# Altium footprint library Atlan.PcbLib: 283 footprints (part 10 of 18)
Each footprint in its own frame and in the unit in brackets; x right, y up, seen from the top. Pads: shape width x height; smd on the part's side, far side on the other; paste and mask are expansions set on the pad; w line width, h text height; cw(c..) or ccw(c..) is an arc to the next point about the centre after c.
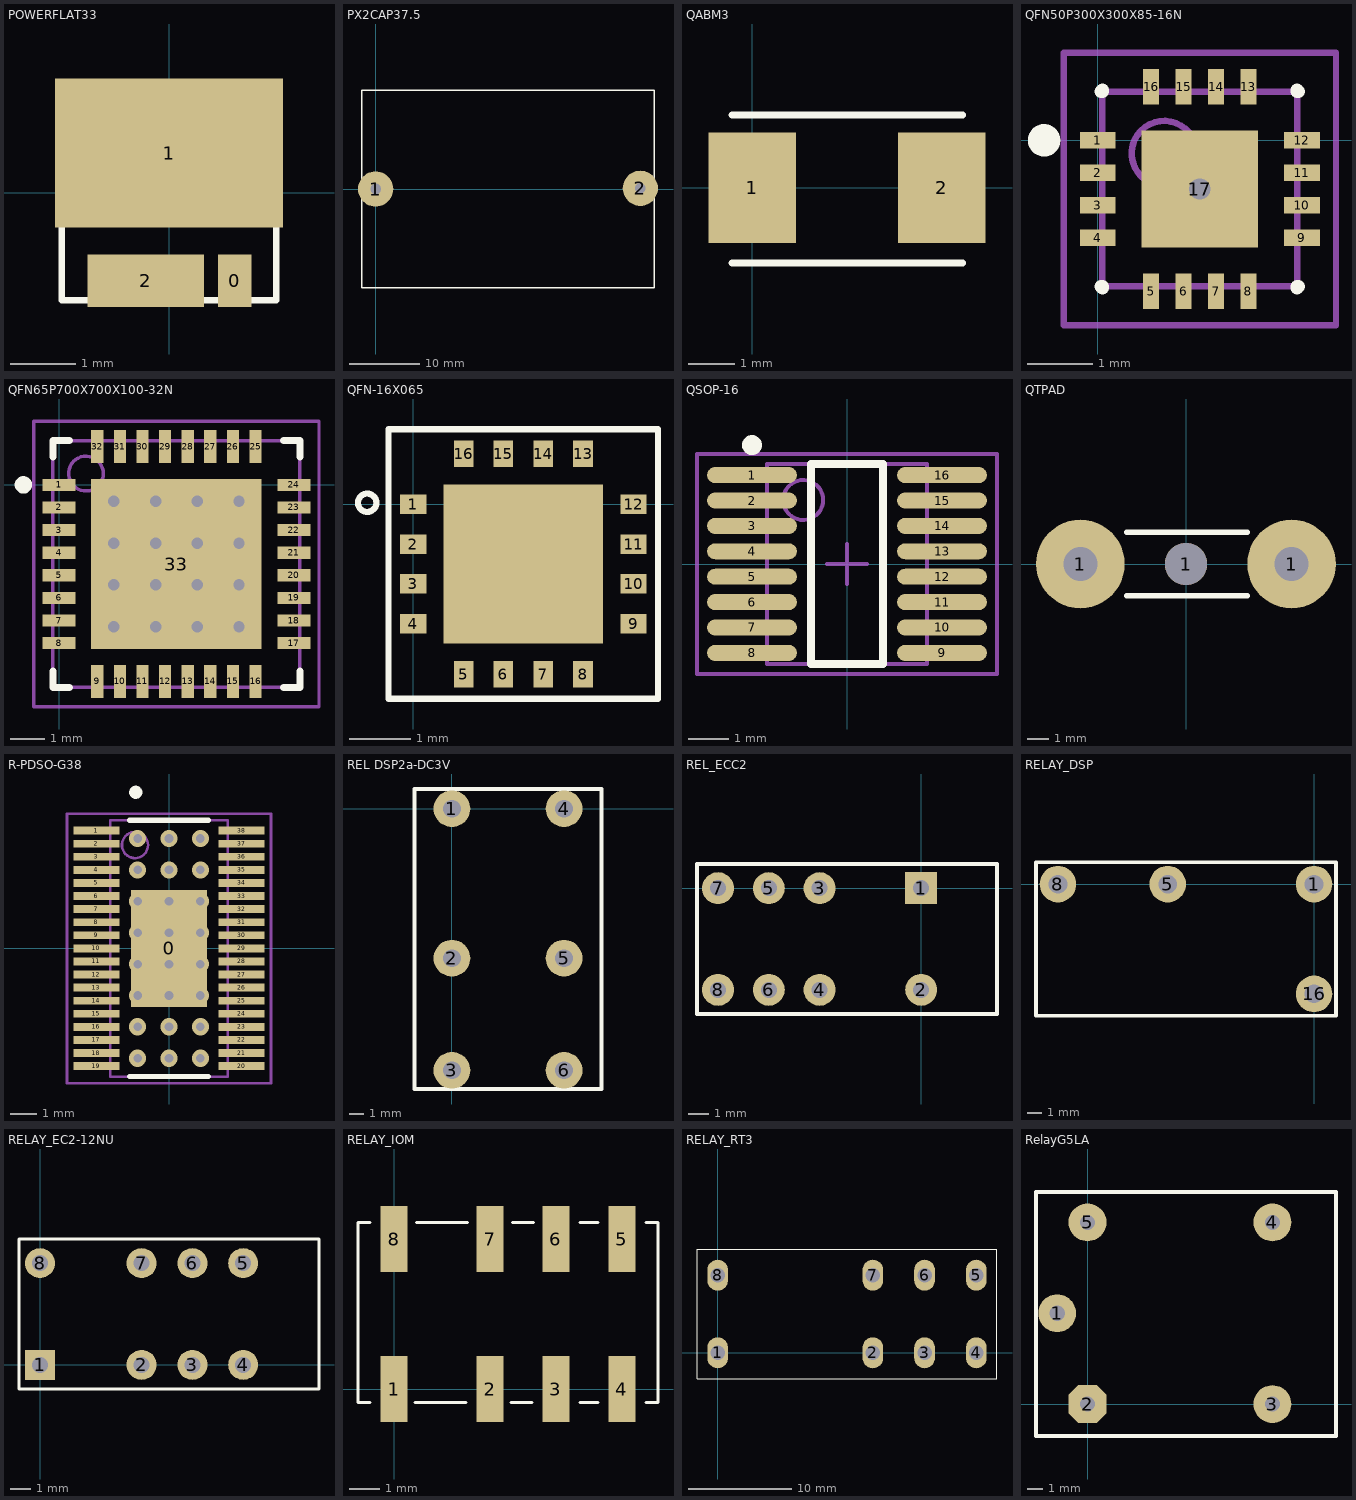
[diagram p9: the footprints below, top view; thin cyan lines are the x and y axes]

## POWERFLAT33 [mm]
pads (3):
  rect 0.52x0.8 smd: 0(1.01,-1.35)
  rect 3.5x2.28 smd: 1(0,0.61)
  rect 1.79x0.8 smd: 2(-0.355,-1.35)
Top Overlay:
  lines w0.1: -1.65,-1.65 -1.65,1.65 1.65,1.65 1.65,-1.65 -1.65,-1.65
3D body: height 1, standoff 0.1, extent -1.65,-1.65 1.65,1.65

## PX2CAP37.5 [mm]
pads (2):
  round 5 hole 1.5: 1(0,0) 2(37.5,0.1)
Top Overlay:
  lines w0.2: -2,-14 -2,14 39.5,14 39.5,-14 -2,-14
3D body: height 42.5, standoff 0, extent -2,-14 39.5,14

## QABM3 [mm]
pads (2):
  rect 1.9x2.4 smd: 1(0,0) 2(4.1,0)
Top Overlay:
  lines w0.15: -0.443,-1.625 4.557,-1.625 ; -0.443,1.575 4.557,1.575

## QFN50P300X300X85-16N [mm] "QFN, 16-Leads, Body 3,0x3,0mm (max), Pitch 0,50mm, IPC Medium Density"
height 0.85
pads (17):
  rect 0.55x0.25 smd: 1(0,0) 2(0,-0.5) 3(0,-1) 4(0,-1.5) 9(3.15,-1.5) 10(3.15,-1) 11(3.15,-0.5) 12(3.15,0)
  rect 0.25x0.55 smd: 5(0.825,-2.325) 6(1.325,-2.325) 7(1.825,-2.325) 8(2.325,-2.325) 13(2.325,0.825) 14(1.825,0.825) 15(1.325,0.825) 16(0.825,0.825)
  rect 1.8x1.8 smd: 17(1.575,-0.75)
via 1.575,-0.75 diameter 0.66 hole 0.33
Top Overlay:
  circle w0.25: c-0.825,0 r0.125
  lines w0.2: 0.05,-2.25 0.075,-2.25 0.075,-2.275 ; 0.05,0.75 0.075,0.75 0.075,0.775 ; 3.075,-2.275 3.075,-2.25 3.1,-2.25 ; 3.075,0.775 3.075,0.75 3.1,0.75
Mechanical 13:
  circle w0.1: c1.025,-0.2 r0.5
  lines w0.1: 0.075,-2.25 0.075,0.75 3.075,0.75 3.075,-2.25 0.075,-2.25
Mechanical 15:
  lines w0.1: 1.075,-0.75 2.075,-0.75 ; 1.575,-1.25 1.575,-0.25 ; -0.525,-2.85 -0.525,1.35 3.675,1.35 3.675,-2.85 -0.525,-2.85
3D body: height 0.85, standoff 0.05, extent 0.075,-2.25 3.075,0.75

## QFN65P700X700X100-32N [mm] "QFN, 32-Leads, Body 7,1x7,1mm (max), Pitch 0,65mm, IPC Medium Density"
height 1
pads (33):
  rect 0.95x0.35 smd: 1(0,0) 2(0,-0.65) 3(0,-1.3) 4(0,-1.95) 5(0,-2.6) 6(0,-3.25) 7(0,-3.9) 8(0,-4.55) 17(6.75,-4.55) 18(6.75,-3.9) 19(6.75,-3.25) 20(6.75,-2.6) 21(6.75,-1.95) 22(6.75,-1.3) 23(6.75,-0.65) 24(6.75,0)
  rect 0.35x0.95 smd: 9(1.1,-5.65) 10(1.75,-5.65) 11(2.4,-5.65) 12(3.05,-5.65) 13(3.7,-5.65) 14(4.35,-5.65) 15(5,-5.65) 16(5.65,-5.65) 25(5.65,1.1) 26(5,1.1) 27(4.35,1.1) 28(3.7,1.1) 29(3.05,1.1) 30(2.4,1.1) 31(1.75,1.1) 32(1.1,1.1)
  rect 4.9x4.9 smd: 33(3.375,-2.275)
via 1.575,-0.475 diameter 0.66 hole 0.33
via 2.775,-0.475 diameter 0.66 hole 0.33
via 3.975,-0.475 diameter 0.66 hole 0.33
via 5.175,-0.475 diameter 0.66 hole 0.33
via 1.575,-1.675 diameter 0.66 hole 0.33
via 2.775,-1.675 diameter 0.66 hole 0.33
via 3.975,-1.675 diameter 0.66 hole 0.33
via 5.175,-1.675 diameter 0.66 hole 0.33
via 1.575,-2.875 diameter 0.66 hole 0.33
via 2.775,-2.875 diameter 0.66 hole 0.33
via 3.975,-2.875 diameter 0.66 hole 0.33
via 5.175,-2.875 diameter 0.66 hole 0.33
via 1.575,-4.075 diameter 0.66 hole 0.33
via 2.775,-4.075 diameter 0.66 hole 0.33
via 3.975,-4.075 diameter 0.66 hole 0.33
via 5.175,-4.075 diameter 0.66 hole 0.33
Top Overlay:
  circle w0.25: c-1.025,0 r0.125
  lines w0.2: -0.175,-5.35 -0.175,-5.825 0.3,-5.825 ; -0.175,0.8 -0.175,1.275 0.3,1.275 ; 6.45,-5.825 6.925,-5.825 6.925,-5.35 ; 6.45,1.275 6.925,1.275 6.925,0.8
Mechanical 13:
  circle w0.1: c0.775,0.325 r0.5
  lines w0.1: -0.175,-5.825 -0.175,1.275 6.925,1.275 6.925,-5.825 -0.175,-5.825
Mechanical 15:
  lines w0.1: 2.875,-2.275 3.875,-2.275 ; 3.375,-2.775 3.375,-1.775 ; -0.725,-6.375 -0.725,1.825 7.475,1.825 7.475,-6.375 -0.725,-6.375
3D body: height 1, standoff 0.05, extent -0.175,-5.825 6.925,1.275

## QFN-16X065 [mm]
pads (17):
  rect 0.43x0.32 smd: 1(0,0) 2(0,-0.65) 3(0,-1.3) 4(0,-1.95) 9(3.6,-1.95) 10(3.6,-1.3) 11(3.6,-0.65) 12(3.6,0)
  rect 0.32x0.43 smd: 5(0.825,-2.775) 6(1.475,-2.775) 7(2.125,-2.775) 8(2.775,-2.775) 13(2.775,0.825) 14(2.125,0.825) 15(1.475,0.825) 16(0.825,0.825)
  rect 2.6x2.6 smd: ""(1.8,-0.975)
Top Overlay:
  circle w0.1: c-0.75,0.025 r0.15
  lines w0.1: -0.4,-3.175 -0.4,1.225 4,1.225 4,-3.175 -0.4,-3.175

## QSOP-16 [mm] "SOP, 16-Leads, Body 4.9x3.9mm, Pitch 0.635mm, IPC Medium Density"
height 1.76
pads (16):
  oval 2.25x0.4 smd: 1(-2.375,2.222) 2(-2.375,1.587) 3(-2.375,0.953) 4(-2.375,0.318) 5(-2.375,-0.318) 6(-2.375,-0.953) 7(-2.375,-1.587) 8(-2.375,-2.222) 9(2.375,-2.222) 10(2.375,-1.587) 11(2.375,-0.953) 12(2.375,-0.318) 13(2.375,0.318) 14(2.375,0.953) 15(2.375,1.587) 16(2.375,2.222)
Top Overlay:
  circle w0.25: c-2.375,2.973 r0.125
  lines w0.2: -0.9,-2.5 -0.9,2.5 0.9,2.5 0.9,-2.5 -0.9,-2.5
Mechanical 13:
  circle w0.1: c-1.095,1.6 r0.5
  lines w0.1: -1.995,-2.5 -1.995,2.5 1.995,2.5 1.995,-2.5 -1.995,-2.5
Mechanical 15:
  lines w0.1: -0.5,0 0.5,0 ; 0,-0.5 0,0.5 ; -3.75,-2.75 -3.75,2.75 3.75,2.75 3.75,-2.75 -3.75,-2.75
3D body: height 1.76, standoff 0, extent -1.995,-2.5 1.995,2.5

## QTPAD [mm]
pads (3):
  round 4.2 hole 1.6: 1(-5,0) 1(5,0)
  round 2 hole 2: 1(0,0)
Top Overlay:
  lines w0.254: -2.8,-1.5 2.9,-1.5 ; -2.8,1.5 2.9,1.5

## R-PDSO-G38 [mm] "PowerPAD Plastic Small-Outline Package"
height 1.2
pads (39):
  rect 2.9x4.48 smd: 0(0,0)
  rect 1.75x0.3 smd mask+0.05: 1(-2.775,4.5) 2(-2.775,4) 3(-2.775,3.5) 4(-2.775,3) 5(-2.775,2.5) 6(-2.775,2) 7(-2.775,1.5) 8(-2.775,1) 9(-2.775,0.5) 10(-2.775,0) 11(-2.775,-0.5) 12(-2.775,-1) 13(-2.775,-1.5) 14(-2.775,-2) 15(-2.775,-2.5) 16(-2.775,-3) 17(-2.775,-3.5) 18(-2.775,-4) 19(-2.775,-4.5) 20(2.775,-4.5) 21(2.775,-4) 22(2.775,-3.5) 23(2.775,-3) 24(2.775,-2.5) 25(2.775,-2) 26(2.775,-1.5) 27(2.775,-1) 28(2.775,-0.5) 29(2.775,0) 30(2.775,0.5) 31(2.775,1) 32(2.775,1.5) 33(2.775,2) 34(2.775,2.5) 35(2.775,3) 36(2.775,3.5) 37(2.775,4) 38(2.775,4.5)
via -1.2,1.8 diameter 0.66 hole 0.33
via 0,1.8 diameter 0.66 hole 0.33
via 1.2,1.8 diameter 0.66 hole 0.33
via -1.2,0.6 diameter 0.66 hole 0.33
via 0,0.6 diameter 0.66 hole 0.33
via 1.2,0.6 diameter 0.66 hole 0.33
via -1.2,-0.6 diameter 0.66 hole 0.33
via 0,-0.6 diameter 0.66 hole 0.33
via 1.2,-0.6 diameter 0.66 hole 0.33
via -1.2,-1.8 diameter 0.66 hole 0.33
via 0,-1.8 diameter 0.66 hole 0.33
via 1.2,-1.8 diameter 0.66 hole 0.33
via 1.2,3 diameter 0.66 hole 0.33
via 0,3 diameter 0.66 hole 0.33
via -1.2,3 diameter 0.66 hole 0.33
via 1.2,4.2 diameter 0.66 hole 0.33
via 0,4.2 diameter 0.66 hole 0.33
via -1.2,4.2 diameter 0.66 hole 0.33
via 1.2,-4.2 diameter 0.66 hole 0.33
via 0,-4.2 diameter 0.66 hole 0.33
via -1.2,-4.2 diameter 0.66 hole 0.33
via 1.2,-3 diameter 0.66 hole 0.33
via 0,-3 diameter 0.66 hole 0.33
via -1.2,-3 diameter 0.66 hole 0.33
Top Overlay:
  circle w0.25: c-1.27,5.967 r0.125
  lines w0.2: -1.5,-4.9 1.5,-4.9 ; -1.5,4.9 1.5,4.9
Mechanical 13:
  circle w0.1: c-1.3,3.95 r0.5
  lines w0.1: -2.25,-4.9 -2.25,4.9 2.25,4.9 2.25,-4.9 -2.25,-4.9
Mechanical 15:
  lines w0.1: -0.5,0 0.5,0 ; 0,-0.5 0,0.5 ; -3.9,-5.15 -3.9,5.15 3.9,5.15 3.9,-5.15 -3.9,-5.15
3D body: height 1.2, standoff 0.25, extent -2.25,-4.9 2.25,4.9

## REL DSP2a-DC3V [mm]
pads (6):
  round 2.5 hole 1.2: 1(0,0) 2(0,-10.16) 3(0,-17.78) 4(7.62,0) 5(7.62,-10.16) 6(7.62,-17.78)
Top Overlay:
  lines w0.254: -2.54,-19.05 10.16,-19.05 10.16,-17.78 10.16,0 10.16,1.34 -2.54,1.34 -2.54,0 -2.54,-17.78 -2.54,-19.05
3D body: height 10, standoff 0, extent -2.54,-19.05 10.16,1.27

## REL_ECC2 [mm]
pads (8):
  rect 1.6x1.6 hole 0.8: 1(0,0)
  round 1.6 hole 0.8: 2(0,-5.08) 3(-5.08,0) 4(-5.08,-5.08) 5(-7.62,0) 6(-7.62,-5.08) 7(-10.16,0) 8(-10.16,-5.08)
Top Overlay:
  lines w0.2: -11.21,-6.29 -11.21,1.21 3.79,1.21 3.79,-6.29 -11.21,-6.29
3D body: height 9.4, standoff 0, extent -11.21,-6.29 3.79,1.21

## RELAY_DSP [mm] "Relay"
pads (4):
  round 2.54 hole 1.3: 1(0,0) 5(-10.16,0) 8(-17.78,0) 16(0,-7.62)
Top Overlay:
  lines w0.25: -19.304,-9.144 -19.304,1.524 1.524,1.524 1.524,-9.144 -19.304,-9.144

## RELAY_EC2-12NU [mm]
height 9.4
pads (8):
  rect 1.5x1.5 hole 0.8: 1(0,0)
  round 1.5 hole 0.8: 2(5.08,0) 3(7.62,0) 4(10.16,0) 5(10.16,5.08) 6(7.62,5.08) 7(5.08,5.08) 8(0,5.08)
Top Overlay:
  lines w0.17: -1.05,-1.21 -1.05,6.29 13.95,6.29 13.95,-1.21 -1.05,-1.21
3D body: height 9.4, standoff 0, extent -1.05,-1.21 13.95,6.29

## RELAY_IOM [mm]
pads (8):
  rect 0.9x2.2 smd: 1(0,0) 2(3.2,0) 3(5.4,0) 4(7.6,0) 5(7.6,5) 6(5.4,5) 7(3.2,5) 8(0,5)
Top Overlay:
  lines w0.102: -0.8,-0.45 -1.2,-0.45 -1.2,5.55 -0.8,5.55 ; 0.7,-0.45 2.4,-0.45 ; 0.75,5.55 2.45,5.55 ; 3.9,-0.45 4.6,-0.45 ; 3.95,5.55 4.65,5.55 ; 6.2,-0.45 6.8,-0.45 ; 6.2,5.55 6.8,5.55 ; 8.4,-0.45 8.8,-0.45 8.8,5.55 8.4,5.55
3D body: height 5.65, standoff 0, extent -1.2,-0.45 8.8,5.55

## RELAY_RT3 [mm]
pads (8):
  oval 2x3 hole 1.4: 1(0,0) 2(15,0) 3(20,0) 4(25,0) 5(25,7.5) 6(20,7.5) 7(15,7.5) 8(0,7.5)
Top Overlay:
  lines w0.102: -2,-2.5 -2,10 27,10 27,-2.5 -2,-2.5
3D body: height 16.2, standoff 0, extent -2,-2.5 27,10

## RelayG5LA [mm]
height 15.8
pads (5):
  round 2.5 hole 1: 1(-2,6) 3(12.2,0) 4(12.2,12) 5(0,12)
  oct 2.5x2.5 hole 1: 2(0,0)
Top Overlay:
  lines w0.25: -3.4,-2.1 16.4,-2.1 16.4,14 -3.4,14 -3.4,-2.1
3D body: height 15.8, standoff 0, extent -3.4,-2.1 16.4,14